# Altium footprint library ACTION标准库.pcblib: 504 footprints (part 19 of 32)
Each footprint in its own frame and in the unit in brackets; x right, y up, seen from the top. Pads: shape width x height; smd on the part's side, far side on the other; paste and mask are expansions set on the pad; w line width, h text height; cw(c..) or ccw(c..) is an arc to the next point about the centre after c.
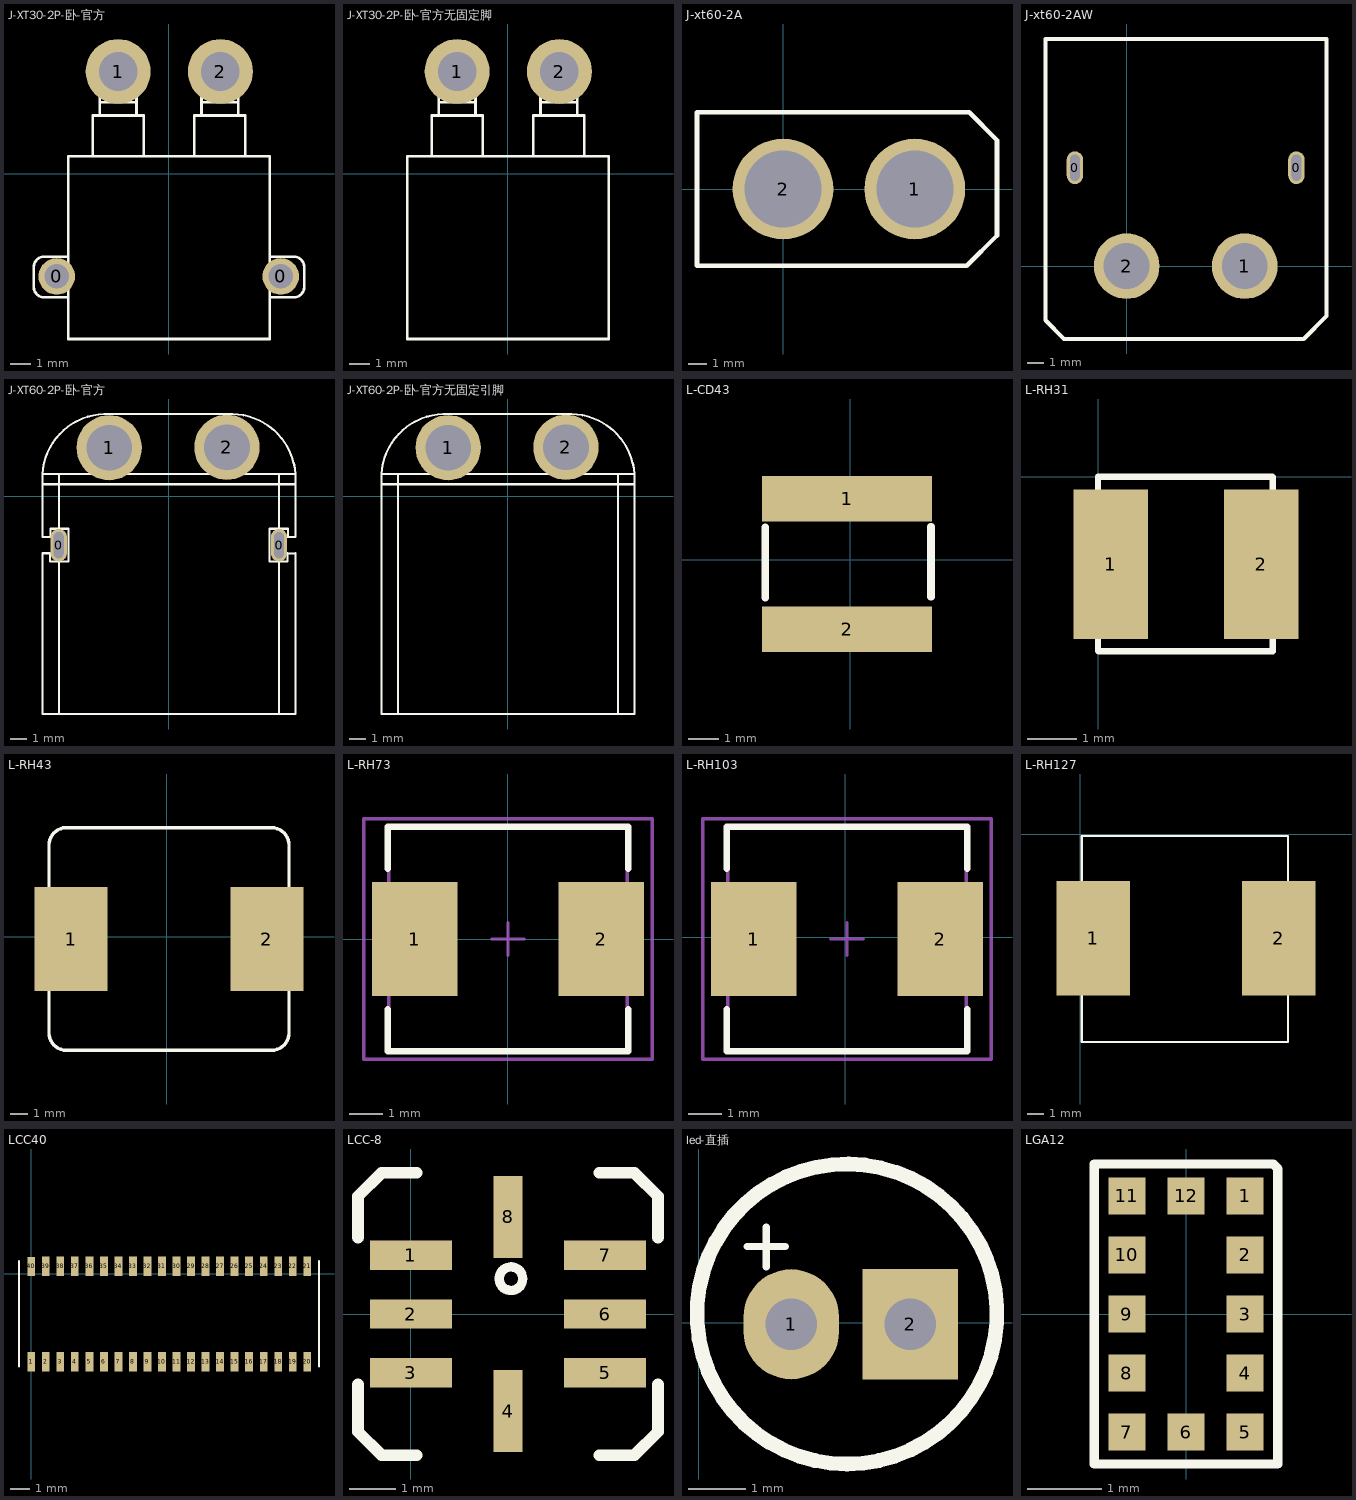
[diagram p18: the footprints below, top view; thin cyan lines are the x and y axes]

## J-XT30-2P-卧-官方 [mm]
pads (4):
  round 1.8 hole 1.2: 0(-5.512,-5.042) 0(5.512,-5.042)
  round 3.2 hole 1.9: 1(-2.489,5.042) 2(2.54,5.042)
Top Overlay:
  circle w0.127: c-5.488,-5.073 r0.55
  circle w0.127: c-5.488,-5.073 r0.5
  circle w0.127: c5.512,-5.073 r0.5
  circle w0.127: c2.513,4.937 r0.5
  circle w0.127: c2.513,4.937 r0.8
  circle w0.127: c-2.487,4.937 r0.5
  circle w0.127: c-2.487,4.937 r0.8
  lines w0.127: -4.938,-6.073 -6.138,-6.073 cw(c-6.138,-5.573) -6.638,-5.573 -6.638,-4.573 cw(c-6.138,-4.573) -6.138,-4.073 -4.938,-4.073 ; -3.738,0.877 -3.738,2.877 -1.238,2.877 -1.238,0.877 ; -3.388,2.877 -3.388,3.527 ; -1.588,2.877 -1.588,3.527 ; 1.262,0.877 1.262,2.877 3.762,2.877 3.762,0.877 ; 1.612,4.927 cw(c2.512,4.927) 3.412,4.927 3.412,3.527 ; 1.612,2.877 1.612,3.527 ; 1.612,4.927 1.612,3.527 ; 3.412,2.877 3.412,3.527 ; 4.962,-6.073 6.162,-6.073 ccw(c6.162,-5.573) 6.662,-5.573 6.662,-4.573 ccw(c6.162,-4.573) 6.162,-4.073 4.962,-4.073 ; -3.388,3.527 -1.588,3.527 ; -3.388,3.527 -3.388,4.927 cw(c-2.488,4.927) -1.588,4.927 -1.588,3.527 ; 1.612,3.527 3.412,3.527 ; -4.938,-8.123 -4.938,0.877 -4.038,0.877 4.062,0.877 4.962,0.877 4.962,-8.123 4.062,-8.123 -4.038,-8.123 -4.938,-8.123
3D body "XT30PW-M 3D DRAWING.STEP": height 5.35, standoff -1.85, extent -6.675,-8.077 6.625,5.873

## J-XT30-2P-卧-官方无固定脚 [mm]
pads (2):
  round 3.2 hole 1.9: 1(-2.489,5.042) 2(2.54,5.042)
Top Overlay:
  circle w0.127: c-2.487,4.937 r0.8
  circle w0.127: c-2.487,4.937 r0.5
  circle w0.127: c2.513,4.937 r0.8
  circle w0.127: c2.513,4.937 r0.5
  lines w0.127: -3.738,0.877 -3.738,2.877 -1.238,2.877 -1.238,0.877 ; -3.388,2.877 -3.388,3.527 ; -1.588,2.877 -1.588,3.527 ; 1.262,0.877 1.262,2.877 3.762,2.877 3.762,0.877 ; 1.612,4.927 cw(c2.512,4.927) 3.412,4.927 3.412,3.527 ; 1.612,2.877 1.612,3.527 ; 1.612,4.927 1.612,3.527 ; 3.412,2.877 3.412,3.527 ; -3.388,3.527 -3.388,4.927 cw(c-2.488,4.927) -1.588,4.927 -1.588,3.527 ; -3.388,3.527 -1.588,3.527 ; 1.612,3.527 3.412,3.527 ; -4.938,-8.123 -4.038,-8.123 4.062,-8.123 4.962,-8.123 4.962,0.877 4.062,0.877 -4.038,0.877 -4.938,0.877 -4.938,-8.123
3D body "XT30PW-M 3D DRAWING 214.STEP": height 5.35, standoff -1.85, extent -6.645,-8.169 6.655,5.781

## J-xt60-2A [mm]
height 1.75
pads (2):
  round 5.5 hole 4.2: 1(7.2,0) 2(0,0)
Top Overlay:
  lines w0.254: -4.699,-4.191 10.033,-4.191 11.684,-2.54 11.684,2.667 10.16,4.191 -4.699,4.191 -4.699,-4.191
3D body: height 5.08, standoff 1.27, extent -4.445,-3.937 10.922,3.937
3D body: height 0.21, standoff 0, extent -0.033,-0.033 0.033,0.033

## J-xt60-2AW [mm]
height 1.75
pads (4):
  oval 1x2 hole 0.6 slot 1.6 at 90 deg: 0(-3.15,6) 0(10.35,6)
  round 4 hole 2.8: 1(7.2,0) 2(0,0)
Top Overlay:
  lines w0.254: -4.953,-3.302 -3.81,-4.445 10.795,-4.445 12.192,-3.048 12.192,13.843 -4.953,13.843 -4.953,-3.302
3D body: height 0.21, standoff 0, extent -0.033,-0.033 0.033,0.033
3D body: height 8.4, standoff 0.5, extent -4.826,2.286 12.065,13.589

## J-XT60-2P-卧-官方 [mm]
pads (4):
  oval 1x2 hole 0.6 slot 1.6 at 90 deg: 0(-6.75,-2.999) 0(6.75,-2.999)
  round 4 hole 2.8: 1(-3.658,2.973) 2(3.556,2.999)
Top Overlay:
  circle w0.127: c-3.605,2.998 r0.961
  circle w0.127: c-3.605,2.998 r1.25
  circle w0.127: c3.595,2.998 r0.961
  circle w0.127: c3.595,2.998 r1.25
  lines w0.127: -7.252,-2.494 -7.252,-1.994 -6.745,-1.994 ; -7.095,0.706 -7.095,0.756 ; -7.055,-2.503 -7.745,-2.503 -7.745,0.706 ; -5.595,0.706 -5.595,0.756 ; 5.605,0.706 5.605,0.756 ; 7.045,-3.503 7.745,-3.503 ; 7.045,-3.498 7.252,-3.498 7.745,-3.498 ; 7.045,-2.503 7.745,-2.503 ; 7.045,-2.498 7.286,-2.498 7.745,-2.498 ; 7.105,0.706 7.105,0.756 ; 7.263,-3.494 7.263,-3.994 6.755,-3.994 ; 7.297,-2.494 7.297,-1.994 6.755,-1.994 ; 7.557,1.356 7.557,1.358 ; 7.755,-3.494 7.755,-13.344 6.755,-13.344 ; 7.755,-2.494 7.755,0.706 ; -7.745,0.706 -6.745,0.706 ; -7.745,0.706 -7.745,0.756 ; -7.745,0.756 -6.745,0.756 ; -7.745,0.756 -7.745,1.356 ; -7.745,1.356 cw(c-3.852,1.136) -3.632,5.029 3.556,5.029 cw(c3.819,1.093) 7.755,1.356 ; -7.745,1.356 -6.745,1.356 ; -6.745,-13.344 6.755,-13.344 ; -6.745,-13.344 -6.745,-3.994 ; -6.745,-13.344 -7.745,-13.344 -7.745,-3.494 -7.286,-3.494 -7.286,-3.994 -6.745,-3.994 ; -6.745,-3.994 -6.145,-3.994 -6.145,-1.994 -6.745,-1.994 ; -6.745,-1.994 -6.745,0.706 ; -6.745,0.706 6.755,0.706 ; -6.745,0.756 -6.745,1.356 ; -6.745,0.756 6.755,0.756 ; -6.745,1.356 6.755,1.356 ; 6.755,-13.344 6.755,-3.994 ; 6.755,-3.994 6.155,-3.994 6.155,-1.994 6.755,-1.994 ; 6.755,-1.994 6.755,0.706 ; 6.755,0.706 7.755,0.706 ; 6.755,0.756 6.755,1.356 ; 6.755,0.756 7.755,0.756 ; 6.755,1.356 7.755,1.356 ; 7.755,0.706 7.755,0.756 ; 7.755,0.756 7.755,1.356
3D body "XT60PW-M 3D DRAWING.STEP": height 8.7, standoff -1.8, extent -7.95,-13.417 7.95,4.883

## J-XT60-2P-卧-官方无固定引脚 [mm]
pads (2):
  round 4 hole 2.8: 1(-3.658,2.973) 2(3.556,2.999)
Top Overlay:
  circle w0.127: c3.595,2.998 r1.25
  circle w0.127: c3.595,2.998 r0.961
  circle w0.127: c-3.605,2.998 r1.25
  circle w0.127: c-3.605,2.998 r0.961
  lines w0.127: -7.745,-3.607 -7.745,0.706 ; -7.745,-3.494 -7.745,-13.344 -6.745,-13.344 ; -7.095,0.706 -7.095,0.756 ; -6.745,-4.242 -6.745,0.706 ; -6.745,-3.994 -6.745,-13.344 ; -5.595,0.706 -5.595,0.756 ; 5.605,0.706 5.605,0.756 ; 6.755,-4.064 6.755,0.706 ; 6.755,-3.994 6.755,-13.344 ; 7.105,0.706 7.105,0.756 ; 7.557,1.356 7.557,1.358 ; 7.755,-3.759 7.755,0.706 ; 7.755,-3.494 7.755,-13.344 6.755,-13.344 ; -7.745,0.706 -7.745,0.756 ; -7.745,0.706 -6.745,0.706 ; -7.745,0.756 -7.745,1.356 ; -7.745,0.756 -6.745,0.756 ; -7.745,1.356 cw(c-3.852,1.136) -3.632,5.029 3.556,5.029 cw(c3.819,1.093) 7.755,1.356 ; -7.745,1.356 -6.745,1.356 ; -6.745,-13.344 6.755,-13.344 ; -6.745,0.706 6.755,0.706 ; -6.745,0.756 6.755,0.756 ; -6.745,0.756 -6.745,1.356 ; -6.745,1.356 6.755,1.356 ; 6.755,0.706 7.755,0.706 ; 6.755,0.756 7.755,0.756 ; 6.755,0.756 6.755,1.356 ; 6.755,1.356 7.755,1.356 ; 7.755,0.706 7.755,0.756 ; 7.755,0.756 7.755,1.356
3D body "XT60PW-M 3D DRAWING 214.STEP": height 8.6, standoff -1.85, extent -7.924,-13.417 7.976,4.883

## L-CD43 [mm]
height 0.5
pads (2):
  rect 5.6x1.5 smd: 1(-0.102,2.007) 2(-0.102,-2.286)
Top Overlay:
  lines w0.254: -2.794,-1.245 -2.794,-1.118 ; -2.794,-1.168 -2.794,1.067 ; 2.667,-1.219 2.667,1.092

## L-RH31 [mm]
pads (2):
  rect 1.5x3 smd: 1(0.254,-1.758) 2(3.282,-1.758)
Top Overlay:
  lines w0.127: 0,-3.5 0,0 3.5,0 ; 0.01,-3.505 3.51,-3.505 3.51,-0.005
3D body: height 1, standoff 0, extent 0,-3.505 3.505,0.025

## L-RH43 [mm]
pads (2):
  rect 4.2x6 smd: 1(-5.498,-0.127) 2(5.752,-0.127)
Top Overlay:
  lines w0.2: -6.773,-3.127 -6.773,-5.527 ccw(c-5.773,-5.527) -5.773,-6.527 6.027,-6.527 ccw(c6.027,-5.527) 7.027,-5.527 7.027,-3.127 ; -6.773,2.873 -6.773,5.273 cw(c-5.773,5.273) -5.773,6.273 ; -5.973,6.273 -5.373,6.273 ; -5.673,6.273 6.027,6.273 cw(c6.027,5.273) 7.027,5.273 7.027,2.873
Mechanical 5:
  lines w0.1: -6.773,-5.527 ccw(c-5.773,-5.527) -5.773,-6.527 ; -6.773,-5.527 ccw(c-5.773,-5.527) -5.773,-6.527 ; -6.773,-5.527 -6.773,5.273 cw(c-5.773,5.273) -5.773,6.273 6.027,6.273 ; -5.773,-6.527 6.027,-6.527 ; 6.027,-6.527 ccw(c6.027,-5.527) 7.027,-5.527 ; 6.027,-6.527 ccw(c6.027,-5.527) 7.027,-5.527 ; 6.027,6.273 cw(c6.027,5.273) 7.027,5.273 ; 6.027,6.273 cw(c6.027,5.273) 7.027,5.273 ; 7.027,-5.527 7.027,5.273
3D body: height 3, standoff 0, extent -6.781,-6.535 7.035,6.281

## L-RH73 [mm] "Molded Capacitor, 2-Leads, Body 6.9x6.5mm, IPC Medium Density"
height 3
pads (2):
  rect 2.6x3.45 smd: 1(-2.815,0.01) 2(2.835,0.01)
Top Overlay:
  lines w0.2: -3.64,-2.115 -3.64,-3.39 3.66,-3.39 3.66,-2.115 ; -3.64,2.135 -3.64,3.41 3.66,3.41 3.66,2.135
Mechanical 13:
  lines w0.1: -3.61,-3.35 -3.61,3.37 3.63,3.37 3.63,-3.35 -3.61,-3.35
Mechanical 15:
  lines w0.1: -0.49,0.01 0.51,0.01 ; 0.01,-0.49 0.01,0.51 ; -4.365,-3.64 -4.365,3.66 4.385,3.66 4.385,-3.64 -4.365,-3.64
3D body: height 3, standoff 0, extent -3.61,-3.35 3.63,3.37

## L-RH103 [mm] "Molded Capacitor, 2-Leads, Body 6.9x6.5mm, IPC Medium Density"
height 3
pads (2):
  rect 2.6x3.45 smd: 1(-2.775,-0.05) 2(2.875,-0.05)
Top Overlay:
  lines w0.2: -3.6,-2.175 -3.6,-3.45 3.7,-3.45 3.7,-2.175 ; -3.6,2.075 -3.6,3.35 3.7,3.35 3.7,2.075
Mechanical 13:
  lines w0.1: -3.57,-3.41 -3.57,3.31 3.67,3.31 3.67,-3.41 -3.57,-3.41
Mechanical 15:
  lines w0.1: -0.45,-0.05 0.55,-0.05 ; 0.05,-0.55 0.05,0.45 ; -4.325,-3.7 -4.325,3.6 4.425,3.6 4.425,-3.7 -4.325,-3.7
3D body: height 3, standoff 0, extent -3.57,-3.41 3.67,3.31

## L-RH127 [mm]
pads (2):
  rect 4.5x7 smd: 1(0.813,-6.35) 2(12.116,-6.35)
Top Overlay:
  lines w0.127: 0.102,-12.675 0.102,-0.102 12.7,-0.102 12.7,-12.675 0.102,-12.675
3D body: height 7, standoff 0, extent 0.025,-12.725 12.802,-0.051

## LCC40 [mm]
pads (40):
  rect 0.4x1 smd: 1(0,-4.555) 2(0.75,-4.555) 3(1.5,-4.555) 4(2.25,-4.555) 5(3,-4.555) 6(3.75,-4.555) 7(4.5,-4.555) 8(5.25,-4.555) 9(6,-4.555) 10(6.75,-4.555) 11(7.5,-4.555) 12(8.25,-4.555) 13(9,-4.555) 14(9.75,-4.555) 15(10.5,-4.555) 16(11.25,-4.555) 17(12,-4.555) 18(12.75,-4.555) 19(13.5,-4.555) 20(14.25,-4.555) 21(14.25,0.381) 22(13.5,0.381) 23(12.75,0.381) 24(12,0.381) 25(11.25,0.381) 26(10.5,0.381) 27(9.75,0.381) 28(9,0.381) 29(8.25,0.381) 30(7.5,0.381) 31(6.75,0.381) 32(6,0.381) 33(5.25,0.381) 34(4.5,0.381) 35(3.75,0.381) 36(3,0.381) 37(2.25,0.381) 38(1.5,0.381) 39(0.75,0.381) 40(0,0.368)
Top Overlay:
  lines w0.127: -0.635,-4.775 -0.635,0.635 ; 14.859,-4.775 14.859,0.635

## LCC-8 [mil]
pads (8):
  rect 70x25 smd: 1(0,50) 2(0,0) 3(0,-50) 5(165,-50) 6(165,0) 7(165,50)
  rect 25x70 smd: 4(82.5,-82.5) 8(82.5,82.5)
Top Overlay:
  circle w8: c85,30 r10
  lines w10: -45,-60 -45,-100 -25,-120 5,-120 ; -45,65 -45,100 -25,120 5,120 ; 160,-120 190,-120 210,-100 210,-60 ; 160,120 190,120 210,100 210,65

## led-直插 [mil]
pads (2):
  oval 65x75 hole 35.13: 1(63,-1)
  rect 65x75 hole 35.13: 2(144,-1)
Top Overlay:
  lines w5: 33,52 59,52 ; 46,38 46,65
  lines w10: -1.1,2.17 cw(c101,6) -1,0
3D body "LED-R.STEP": height 326.77, standoff -118.11, extent 11.45,-100 192.55,100.79

## LGA12 [mm]
pads (12):
  rect 0.5x0.5 smd: 1(0.8,1.6) 2(0.8,0.8) 3(0.8,0) 4(0.8,-0.8) 5(0.8,-1.6) 6(0,-1.6) 7(-0.8,-1.6) 8(-0.8,-0.8) 9(-0.8,0) 10(-0.8,0.8) 11(-0.8,1.6) 12(0,1.6)
Top Overlay:
  lines w0.127: -1.245,-2.032 -1.245,2.032 1.181,2.032 1.245,1.968 1.245,-2.032 -1.245,-2.032
3D body: height 1.05, standoff 0, extent -1.168,-1.956 1.143,1.956